# Altium footprint library MOLEX SMD.PcbLib: 54 footprints (part 1 of 4) (continued)
## MOLEX_47151-0001 [mm] "19 Pin, 0.50mm Pitch, 1.0 HDMI Right Angle Header" (continued)
Mechanical 15:
  lines w0.05: -7.75,-11.56 -7.75,1.55 7.75,1.55 7.75,-11.56 -7.75,-11.56
3D body "MOLEX_47151-0001.stp": height 6.18, standoff -2.2, extent -7.5,-11.31 7.5,0.84

## MOLEX_47272-0001 [mm] "20 Circuits, 0.50mm Pitch, Right Angle DisplayPort* Male Receptacle"
height 5.63
pads (25):
  rect 0.28x2.4 smd: 1(4.75,0) 2(4.25,0) 3(3.75,0) 4(3.25,0) 5(2.75,0) 6(2.25,0) 7(1.75,0) 8(1.25,0) 9(0.75,0) 10(0.25,0) 11(-0.25,0) 12(-0.75,0) 13(-1.25,0) 14(-1.75,0) 15(-2.25,0) 16(-2.75,0) 17(-3.25,0) 18(-3.75,0) 19(-4.25,0) 20(-4.75,0)
  round 0.5 hole 1.4 unplated mask+0.45: MTG1(-0.75,-10.28)
  oval 1.2x2.3 hole 0.6 slot 1.7 at 90 deg: SHIELD(-9,-9.38) SHIELD(7.5,-9.38)
  oval 1.2x2.8 hole 0.6 slot 2.2 at 90 deg: SHIELD(-9,-2.6) SHIELD(7.5,-2.6)
Top Overlay:
  circle w0.25: c4.846,1.691 r0.125
  lines w0.2: -9.2,-13.88 -7.4,-13.88 -7.4,-14.58 6.75,-14.58 6.75,-13.88 7.7,-13.88 ; -9.2,-10.91 -9.2,-14.08 cw(c-9.3,-14.08) -9.3,-14.18 -9.645,-14.18 -9.645,-14.58 -9.3,-14.58 ccw(c-9.3,-14.08) -8.8,-14.08 -8.8,-13.88 ; -9.2,-7.85 -9.2,-4.38 ; -9.2,-0.82 -9.2,-0.39 -9.15,-0.39 -9.15,-0.19 -7.2,-0.19 -7.2,-0.601 -5.29,-0.601 ; -8.15,-1.273 -8.15,-0.19 ; -8.006,-1.69 6.506,-1.69 ; -7.75,-1.69 -7.75,-0.19 ; -7.4,-14.18 6.75,-14.18 ; -7.4,-14.08 6.75,-14.08 ; -6.35,-7.66 -6.35,-9.96 cw(c-6.45,-9.96) -6.45,-10.06 -7.05,-10.06 cw(c-7.05,-9.96) -7.15,-9.96 -7.15,-7.66 cw(c-7.05,-7.66) -7.05,-7.56 -6.45,-7.56 cw(c-6.45,-7.66) -6.35,-7.66 ; 5.29,-0.601 5.7,-0.601 5.7,-0.19 7.65,-0.19 7.65,-0.811 ; 5.85,-7.66 5.85,-9.96 ccw(c5.95,-9.96) 5.95,-10.06 6.508,-10.06 ; 5.85,-7.66 cw(c5.95,-7.66) 5.95,-7.56 6.55,-7.56 cw(c6.55,-7.66) 6.65,-7.66 6.65,-8.303 ; 6.25,-1.69 6.25,-0.19 ; 7.15,-0.863 7.15,-0.19 ; 7.3,-13.88 7.3,-14.08 ccw(c7.8,-14.08) 7.8,-14.58 8.14,-14.58 8.14,-14.18 7.8,-14.18 cw(c7.8,-14.08) 7.7,-14.08 7.7,-10.91 ; 7.65,-0.39 7.7,-0.39 7.7,-0.82 ; 7.7,-7.85 7.7,-4.38 ; -4.925,-11.08 ccw(c-4.425,-11.08) -4.425,-11.58 -2.835,-11.58 ccw(c-2.835,-11.08) -2.335,-11.08 -2.335,-7.08 ccw(c-2.585,-7.08) -2.835,-7.08 -2.835,-7.34 -3.035,-9.79 -3.035,-10.99 -4.235,-10.99 -4.235,-9.79 -4.435,-7.34 -4.435,-7.13 -4.425,-7.13 -4.425,-7.08 ccw(c-4.675,-7.08) -4.925,-7.08 -4.925,-11.08 ; 0.835,-11.08 ccw(c1.335,-11.08) 1.335,-11.58 2.925,-11.58 ccw(c2.925,-11.08) 3.425,-11.08 3.425,-7.08 ccw(c3.175,-7.08) 2.925,-7.08 2.925,-7.13 2.935,-7.13 2.935,-7.34 2.735,-9.79 2.735,-10.99 1.535,-10.99 1.535,-9.79 1.335,-7.34 1.335,-7.08 ccw(c1.085,-7.08) 0.835,-7.08 0.835,-11.08
Mechanical 8:
  drawing of 179 lines, arcs and shapes, not listed
Mechanical 14:
  circle w0.25: c4.846,1.691 r0.125
  lines w0.1: -9.2,-13.88 -7.4,-13.88 -7.4,-14.58 6.75,-14.58 6.75,-13.88 7.7,-13.88 ; -9.2,-1.69 7.7,-1.69 ; -8.8,-13.88 -8.8,-14.08 cw(c-9.3,-14.08) -9.3,-14.58 -9.645,-14.58 -9.645,-14.18 -9.3,-14.18 ccw(c-9.3,-14.08) -9.2,-14.08 -9.2,-0.39 -9.15,-0.39 -9.15,-0.19 -7.2,-0.19 -7.2,-0.601 5.7,-0.601 5.7,-0.19 7.65,-0.19 7.65,-1.69 ; -8.15,-1.69 -8.15,-0.19 ; -7.75,-1.69 -7.75,-0.19 ; -7.4,-14.18 6.75,-14.18 ; -7.4,-14.08 6.75,-14.08 ; -6.35,-7.66 -6.35,-9.96 cw(c-6.45,-9.96) -6.45,-10.06 -7.05,-10.06 cw(c-7.05,-9.96) -7.15,-9.96 -7.15,-7.66 cw(c-7.05,-7.66) -7.05,-7.56 -6.45,-7.56 cw(c-6.45,-7.66) -6.35,-7.66 ; 5.85,-7.66 5.85,-9.96 ccw(c5.95,-9.96) 5.95,-10.06 6.55,-10.06 ccw(c6.55,-9.96) 6.65,-9.96 6.65,-7.66 ccw(c6.55,-7.66) 6.55,-7.56 5.95,-7.56 ccw(c5.95,-7.66) 5.85,-7.66 ; 6.25,-1.69 6.25,-0.19 ; 7.15,-1.69 7.15,-0.19 ; 7.3,-13.88 7.3,-14.08 ccw(c7.8,-14.08) 7.8,-14.58 8.14,-14.58 8.14,-14.18 7.8,-14.18 cw(c7.8,-14.08) 7.7,-14.08 7.7,-0.39 7.65,-0.39 ; -4.925,-11.08 ccw(c-4.425,-11.08) -4.425,-11.58 -2.835,-11.58 ccw(c-2.835,-11.08) -2.335,-11.08 -2.335,-7.08 ccw(c-2.585,-7.08) -2.835,-7.08 -2.835,-7.34 -3.035,-9.79 -3.035,-10.99 -4.235,-10.99 -4.235,-9.79 -4.435,-7.34 -4.435,-7.13 -4.425,-7.13 -4.425,-7.08 ccw(c-4.675,-7.08) -4.925,-7.08 -4.925,-11.08 ; 0.835,-11.08 ccw(c1.335,-11.08) 1.335,-11.58 2.925,-11.58 ccw(c2.925,-11.08) 3.425,-11.08 3.425,-7.08 ccw(c3.175,-7.08) 2.925,-7.08 2.925,-7.13 2.935,-7.13 2.935,-7.34 2.735,-9.79 2.735,-10.99 1.535,-10.99 1.535,-9.79 1.335,-7.34 1.335,-7.08 ccw(c1.085,-7.08) 0.835,-7.08 0.835,-11.08
Mechanical 15:
  lines w0.05: -9.895,-14.83 8.39,-14.83 8.39,1.45 -9.895,1.45 -9.895,-14.83
3D body "MOLEX_47272-0001.stp": height 6.65, standoff -2.1, extent -9.645,-14.58 8.14,0.31

## MOLEX_47309-2651 [mm] "1.10mm Pitch microSD Card Header with Detect Switch"
height 2.65
pads (12):
  rect 0.6x1.25 smd: 1(3.85,0) 2(2.75,0) 3(1.65,0) 4(0.55,0) 5(-0.55,0) 6(-1.65,0) 7(-2.75,0) 8(-3.85,0)
  rect 1.2x3.79 smd: G1(-5,-2.48)
  rect 1.45x1.4 smd: G2(5.475,-1.725)
  rect 1x0.6 smd: G3(5.7,-2.975)
  rect 0.95x0.85 smd: G4(4.775,-3.95)
Top Overlay:
  circle w0.25: c3.85,1.975 r0.125
  lines w0.2: -5.4,-0.235 -5.4,0.425 -4.5,0.425 ; -4.05,-4.175 3.95,-4.175 ; -3.3,0.975 -3.3,1.325 3.9,1.325 3.9,0.975 ; 4.5,0.425 6,0.425 6,-0.675 ; 4.526,0.425 cw(c4.83,0.165) 4.881,0.562 ccw(c4.9,0.705) 4.955,0.839 5.104,0.925 cw(c4.9,0.705) 5.007,0.425 ; 4.6,-0.675 4.6,-0.585 5,-0.585 5,-0.675 5.4,-0.675 5.4,-0.585 6,-0.585 ; 5.35,0.425 5.35,1.125 5.5,1.125 5.5,0.425 ; 5.6,-4.175 6,-4.175 6,-3.625
Mechanical 8:
  lines w0.05: -0.354,-0.354 0,0 ; -0.354,0.354 0,0 ; 0.354,-0.354 0,0 ; 0.354,0.354 0,0 ; -5.6,-4.375 -5,-2.48 -4.4,-4.375 ; -5.6,-4.375 -4.4,-4.375 ; -5.6,-4.375 -5.6,-0.585 -4.4,-0.585 -4.4,-4.375 ; -4.15,0.625 -3.85,0 -3.55,0.625 ; -4.15,0.625 -4.15,-0.625 -3.55,-0.625 -3.55,0.625 ; -4.15,0.625 -3.55,0.625 ; -3.05,0.625 -2.75,0 -2.45,0.625 ; -3.05,0.625 -3.05,-0.625 -2.45,-0.625 -2.45,0.625 ; -3.05,0.625 -2.45,0.625 ; -1.95,0.625 -1.65,0 -1.35,0.625 ; -1.95,0.625 -1.95,-0.625 -1.35,-0.625 -1.35,0.625 ; -1.95,0.625 -1.35,0.625 ; -0.85,0.625 -0.55,0 -0.25,0.625 ; -0.85,0.625 -0.85,-0.625 -0.25,-0.625 -0.25,0.625 ; -0.85,0.625 -0.25,0.625 ; 0.25,0.625 0.55,0 0.85,0.625 ; 0.25,0.625 0.25,-0.625 0.85,-0.625 0.85,0.625 ; 0.25,0.625 0.85,0.625 ; 1.35,0.625 1.65,0 1.95,0.625 ; 1.35,0.625 1.35,-0.625 1.95,-0.625 1.95,0.625 ; 1.35,0.625 1.95,0.625 ; 2.45,0.625 2.75,0 3.05,0.625 ; 2.45,0.625 2.45,-0.625 3.05,-0.625 3.05,0.625 ; 2.45,0.625 3.05,0.625 ; 3.55,0.625 3.85,0 4.15,0.625 ; 3.55,0.625 3.55,-0.625 4.15,-0.625 4.15,0.625 ; 3.55,0.625 4.15,0.625 ; 4.3,-4.375 4.775,-3.95 5.25,-4.375 ; 4.3,-4.375 5.25,-4.375 ; 4.3,-4.375 4.3,-3.525 5.25,-3.525 5.25,-4.375 ; 4.75,-2.425 5.475,-1.725 6.2,-2.425 ; 4.75,-2.425 6.2,-2.425 ; 4.75,-2.425 4.75,-1.025 6.2,-1.025 6.2,-2.425 ; 5.2,-3.275 5.7,-2.975 6.2,-3.275 ; 5.2,-3.275 6.2,-3.275 ; 5.2,-3.275 5.2,-2.675 6.2,-2.675 6.2,-3.275
Mechanical 14:
  lines w0.1: -4,0.425 -4,0.475 -3.7,0.475 -3.7,0.425 ; 3.913,0.475 4,0.475 4,0.425 ; 4.526,0.425 cw(c4.83,0.165) 4.881,0.562 ccw(c4.9,0.705) 4.955,0.839 5.104,0.925 cw(c4.9,0.705) 5.007,0.425 ; 5,-1.935 5.4,-1.935 ; 5,-1.508 5.4,-1.508 ; 5,-1.102 5.4,-1.102 ; 5,-0.675 5.4,-0.675 ; 5.35,0.425 5.35,1.125 5.5,1.125 5.5,0.425 ; 6,-2.025 5.4,-2.025 5.4,-0.585 6,-0.585 ; 4,0.425 cw(c4,0.525) 3.9,0.525 3.9,1.325 -3.3,1.325 -3.3,0.525 cw(c-3.4,0.525) -3.4,0.425 -5.4,0.425 -5.4,-4.175 6,-4.175 6,0.425 4,0.425 ; 4.6,-2.025 4.6,-0.585 5,-0.585 5,-2.025 4.6,-2.025
Mechanical 15:
  lines w0.05: -5.85,-4.625 -5.85,1.575 6.45,1.575 6.45,-4.625 -5.85,-4.625
3D body "MOLEX_47309-2651.stp": height 2.65, standoff 0, extent -5.4,-4.175 6,1.325

## MOLEX_48307-7022 [mm] "19 Contacts, Pitch 0.5mm, Vertical, HDMI Receptacle"
height 10.7
pads (24):
  rect 0.3x1.7 smd: 1(4.201,3.215) 2(3.701,3.215) 3(3.201,3.215) 4(2.701,3.215) 5(2.201,3.215) 6(1.701,3.215) 7(1.201,3.215) 8(0.701,3.215) 9(0.201,3.215) 10(-0.299,3.215) 11(-0.799,3.215) 12(-1.299,3.215) 13(-1.799,3.215) 14(-2.299,3.215) 15(-2.799,3.215) 16(-3.299,3.215) 17(-3.799,3.215) 18(-4.299,3.215) 19(-4.799,3.215) NC1(5.201,3.215) NC2(4.701,3.215)
  round 1.9 hole 1.3: SHIELD(-7.259,0.765) SHIELD(-0.009,-2.535) SHIELD(7.241,0.765)
Top Overlay:
  drawing of 208 lines, arcs and shapes, not listed
Mechanical 8:
  circle w0.1: c-0.009,-2.535 r0.95
  circle w0.1: c-7.259,0.765 r0.95
  circle w0.1: c7.241,0.765 r0.95
  lines w0.1: -14.259,0.765 -13.759,0.765 ; -13.759,0.265 -13.759,0.765 ; -13.759,1.265 -13.759,0.765 ; -13.259,0.765 -13.759,0.765 ; -7.759,0.765 -7.259,0.765 ; -7.259,0.265 -7.259,0.765 ; -7.259,1.265 -7.259,0.765 ; -6.759,0.765 -7.259,0.765 ; -0.659,-2.535 0.641,-2.535 ; -0.509,-2.535 -0.009,-2.535 ; -0.009,-3.035 -0.009,-2.535 ; -0.009,-2.035 -0.009,-2.535 ; 0.491,-2.535 -0.009,-2.535 ; 6.741,0.765 7.241,0.765 ; 7.241,0.265 7.241,0.765 ; 7.241,1.265 7.241,0.765 ; 7.741,0.765 7.241,0.765 ; 13.241,0.765 13.741,0.765 ; 13.741,0.265 13.741,0.765 ; 13.741,1.265 13.741,0.765 ; 14.241,0.765 13.741,0.765 ; -4.949,4.065 -4.799,3.215 -4.649,4.065 ; -4.949,4.065 -4.649,4.065 ; -4.949,4.065 -4.949,2.365 -4.649,2.365 -4.649,4.065 ; -4.449,4.065 -4.299,3.215 -4.149,4.065 ; -4.449,4.065 -4.149,4.065 ; -4.449,4.065 -4.449,2.365 -4.149,2.365 -4.149,4.065 ; -3.949,4.065 -3.799,3.215 -3.649,4.065 ; -3.949,4.065 -3.649,4.065 ; -3.949,4.065 -3.949,2.365 -3.649,2.365 -3.649,4.065 ; -3.449,4.065 -3.299,3.215 -3.149,4.065 ; -3.449,4.065 -3.149,4.065 ; -3.449,4.065 -3.449,2.365 -3.149,2.365 -3.149,4.065 ; -2.949,4.065 -2.799,3.215 -2.649,4.065 ; -2.949,4.065 -2.649,4.065 ; -2.949,4.065 -2.949,2.365 -2.649,2.365 -2.649,4.065 ; -2.449,4.065 -2.299,3.215 -2.149,4.065 ; -2.449,4.065 -2.149,4.065 ; -2.449,4.065 -2.449,2.365 -2.149,2.365 -2.149,4.065 ; -1.949,4.065 -1.799,3.215 -1.649,4.065 ; -1.949,4.065 -1.649,4.065 ; -1.949,4.065 -1.949,2.365 -1.649,2.365 -1.649,4.065 ; -1.449,4.065 -1.299,3.215 -1.149,4.065 ; -1.449,4.065 -1.149,4.065 ; -1.449,4.065 -1.449,2.365 -1.149,2.365 -1.149,4.065 ; -0.949,4.065 -0.799,3.215 -0.649,4.065 ; -0.949,4.065 -0.649,4.065 ; -0.949,4.065 -0.949,2.365 -0.649,2.365 -0.649,4.065 ; -0.449,4.065 -0.299,3.215 -0.149,4.065 ; -0.449,4.065 -0.149,4.065 ; -0.449,4.065 -0.449,2.365 -0.149,2.365 -0.149,4.065 ; 0.051,4.065 0.201,3.215 0.351,4.065 ; 0.051,4.065 0.351,4.065 ; 0.051,4.065 0.051,2.365 0.351,2.365 0.351,4.065 ; 0.551,4.065 0.701,3.215 0.851,4.065 ; 0.551,4.065 0.851,4.065 ; 0.551,4.065 0.551,2.365 0.851,2.365 0.851,4.065 ; 1.051,4.065 1.201,3.215 1.351,4.065 ; 1.051,4.065 1.351,4.065 ; 1.051,4.065 1.051,2.365 1.351,2.365 1.351,4.065 ; 1.551,4.065 1.701,3.215 1.851,4.065 ; 1.551,4.065 1.851,4.065 ; 1.551,4.065 1.551,2.365 1.851,2.365 1.851,4.065 ; 2.051,4.065 2.201,3.215 2.351,4.065 ; 2.051,4.065 2.351,4.065 ; 2.051,4.065 2.051,2.365 2.351,2.365 2.351,4.065 ; 2.551,4.065 2.701,3.215 2.851,4.065 ; 2.551,4.065 2.851,4.065 ; 2.551,4.065 2.551,2.365 2.851,2.365 2.851,4.065 ; 3.051,4.065 3.201,3.215 3.351,4.065 ; 3.051,4.065 3.351,4.065 ; 3.051,4.065 3.051,2.365 3.351,2.365 3.351,4.065 ; 3.551,4.065 3.701,3.215 3.851,4.065 ; 3.551,4.065 3.851,4.065 ; 3.551,4.065 3.551,2.365 3.851,2.365 3.851,4.065 ; 4.051,4.065 4.201,3.215 4.351,4.065 ; 4.051,4.065 4.351,4.065 ; 4.051,4.065 4.051,2.365 4.351,2.365 4.351,4.065 ; 4.551,4.065 4.701,3.215 4.851,4.065 ; 4.551,4.065 4.851,4.065 ; 4.551,4.065 4.551,2.365 4.851,2.365 4.851,4.065 ; 5.051,4.065 5.201,3.215 5.351,4.065 ; 5.051,4.065 5.351,4.065 ; 5.051,4.065 5.051,2.365 5.351,2.365 5.351,4.065
Mechanical 14:
  drawing of 235 lines, arcs and shapes, not listed
Mechanical 15:
  lines w0.05: -17.059,-4.435 -17.059,4.765 17.041,4.765 17.041,-4.435 -17.059,-4.435
3D body "MOLEX_48307-7022.stp": height 10.55, standoff -2.45, extent -16.8,-4.175 16.8,4.525

## MOLEX_51338-0474 [mm] "0.40mm Pitch SlimStack Dual Row 40 Circuits Surface Mount Vertical Receptacle"
height 1.36
pads (44):
  rect 0.22x0.7 smd: 1(-3.8,1.55) 2(-3.8,-1.55) 3(-3.4,1.55) 4(-3.4,-1.55) 5(-3,1.55) 6(-3,-1.55) 7(-2.6,1.55) 8(-2.6,-1.55) 9(-2.2,1.55) 10(-2.2,-1.55) 11(-1.8,1.55) 12(-1.8,-1.55) 13(-1.4,1.55) 14(-1.4,-1.55) 15(-1,1.55) 16(-1,-1.55) 17(-0.6,1.55) 18(-0.6,-1.55) 19(-0.2,1.55) 20(-0.2,-1.55) 21(0.2,1.55) 22(0.2,-1.55) 23(0.6,1.55) 24(0.6,-1.55) 25(1,1.55) 26(1,-1.55) 27(1.4,1.55) 28(1.4,-1.55) 29(1.8,1.55) 30(1.8,-1.55) 31(2.2,1.55) 32(2.2,-1.55) 33(2.6,1.55) 34(2.6,-1.55) 35(3,1.55) 36(3,-1.55) 37(3.4,1.55) 38(3.4,-1.55) 39(3.8,1.55) 40(3.8,-1.55)
  rect 1x0.5 smd: MECH(-4.75,-1.5) MECH(-4.75,1.5) MECH(4.75,-1.5) MECH(4.75,1.5)
Top Layer:
  region: -3.69,1.9 -3.91,1.9 -3.91,0.75 -3.69,0.75
  region: -3.91,-1.9 -3.69,-1.9 -3.69,-0.75 -3.91,-0.75
  region: -3.29,1.9 -3.51,1.9 -3.51,0.75 -3.29,0.75
  region: -3.51,-1.9 -3.29,-1.9 -3.29,-0.75 -3.51,-0.75
  region: -2.89,1.9 -3.11,1.9 -3.11,0.75 -2.89,0.75
  region: -3.11,-1.9 -2.89,-1.9 -2.89,-0.75 -3.11,-0.75
  region: -2.49,1.9 -2.71,1.9 -2.71,0.75 -2.49,0.75
  region: -2.71,-1.9 -2.49,-1.9 -2.49,-0.75 -2.71,-0.75
  region: -2.09,1.9 -2.31,1.9 -2.31,0.75 -2.09,0.75
  region: -2.31,-1.9 -2.09,-1.9 -2.09,-0.75 -2.31,-0.75
  region: -1.69,1.9 -1.91,1.9 -1.91,0.75 -1.69,0.75
  region: -1.91,-1.9 -1.69,-1.9 -1.69,-0.75 -1.91,-0.75
  region: -1.29,1.9 -1.51,1.9 -1.51,0.75 -1.29,0.75
  region: -1.51,-1.9 -1.29,-1.9 -1.29,-0.75 -1.51,-0.75
  region: -0.89,1.9 -1.11,1.9 -1.11,0.75 -0.89,0.75
  region: -1.11,-1.9 -0.89,-1.9 -0.89,-0.75 -1.11,-0.75
  region: -0.49,1.9 -0.71,1.9 -0.71,0.75 -0.49,0.75
  region: -0.71,-1.9 -0.49,-1.9 -0.49,-0.75 -0.71,-0.75
  region: -0.09,1.9 -0.31,1.9 -0.31,0.75 -0.09,0.75
  region: -0.31,-1.9 -0.09,-1.9 -0.09,-0.75 -0.31,-0.75
  region: 0.31,1.9 0.09,1.9 0.09,0.75 0.31,0.75
  region: 0.09,-1.9 0.31,-1.9 0.31,-0.75 0.09,-0.75
  region: 0.71,1.9 0.49,1.9 0.49,0.75 0.71,0.75
  region: 0.49,-1.9 0.71,-1.9 0.71,-0.75 0.49,-0.75
  region: 1.11,1.9 0.89,1.9 0.89,0.75 1.11,0.75
  region: 0.89,-1.9 1.11,-1.9 1.11,-0.75 0.89,-0.75
  region: 1.51,1.9 1.29,1.9 1.29,0.75 1.51,0.75
  region: 1.29,-1.9 1.51,-1.9 1.51,-0.75 1.29,-0.75
  region: 1.91,1.9 1.69,1.9 1.69,0.75 1.91,0.75
  region: 1.69,-1.9 1.91,-1.9 1.91,-0.75 1.69,-0.75
  region: 2.31,1.9 2.09,1.9 2.09,0.75 2.31,0.75
  region: 2.09,-1.9 2.31,-1.9 2.31,-0.75 2.09,-0.75
  region: 2.71,1.9 2.49,1.9 2.49,0.75 2.71,0.75
  region: 2.49,-1.9 2.71,-1.9 2.71,-0.75 2.49,-0.75
  region: 3.11,1.9 2.89,1.9 2.89,0.75 3.11,0.75
  region: 2.89,-1.9 3.11,-1.9 3.11,-0.75 2.89,-0.75
  region: 3.51,1.9 3.29,1.9 3.29,0.75 3.51,0.75
  region: 3.29,-1.9 3.51,-1.9 3.51,-0.75 3.29,-0.75
  region: 3.91,1.9 3.69,1.9 3.69,0.75 3.91,0.75
  region: 3.69,-1.9 3.91,-1.9 3.91,-0.75 3.69,-0.75
Top Overlay:
  drawing of 217 lines, arcs and shapes, not listed
Mechanical 8:
  drawing of 284 lines, arcs and shapes, not listed
Mechanical 14:
  drawing of 253 lines, arcs and shapes, not listed
Mechanical 15:
  lines w0.05: -5.797,-2.15 -5.797,2.15 5.8,2.15 5.8,-2.15 -5.797,-2.15
3D body "MOLEX_51338-0474.stp": height 1.4, standoff 0, extent -5.55,-1.705 5.55,1.705

## MOLEX_52610-0871 [mm] "8 Contacts, 1.0mm Pitch,  Vertical Surface Mount FCC/FPC Connector"
height 7.25
pads (16):
  rect 0.6x2.075 smd: 1(-3.5,-1.687) 2(-2.5,-1.687) 3(-1.5,-1.687) 4(-0.5,-1.687) 5(0.5,-1.687) 6(1.5,-1.687) 7(2.5,-1.687) 8(3.5,-1.687)
  rect 0.6x1.85 smd: 1(-3.5,1.825) 2(-2.5,1.825) 3(-1.5,1.825) 4(-0.5,1.825) 5(0.5,1.825) 6(1.5,1.825) 7(2.5,1.825) 8(3.5,1.825)
Top Overlay:
  lines w0.2: -7.3,1.8 -7.3,-1.5 -7,-1.8 -4.2,-1.8 ; -7.295,1.8 -4.2,1.8 ; -6.5,1.8 -6.211,1.3 -5.925,1.8 ; -4.3,1.8 -4.3,1.05 -4.2,1.05 ; 4.2,-1.8 7,-1.8 7.3,-1.5 7.3,1.8 4.2,1.8 ; 4.2,1.05 4.3,1.05 4.3,1.8 ; -4.85,-0.05 -4.85,1.8 -4.6,1.55 -4.6,0.2 ; -4.85,-0.05 4.85,-0.05 ; -4.85,-0.05 -4.6,0.2 ; -4.6,0.2 4.6,0.2 ; 4.6,0.2 4.6,1.55 4.85,1.8 4.85,-0.05 ; 4.6,0.2 4.85,-0.05
Mechanical 8:
  lines w0.1: -7.3,1.8 7.3,1.8 ; -4,-1.687 -3.5,-1.687 ; -4,1.825 -3.5,1.825 ; -3.5,-2.188 -3.5,-1.687 ; -3.5,-1.188 -3.5,-1.687 ; -3.5,1.325 -3.5,1.825 ; -3.5,2.325 -3.5,1.825 ; -3,-1.687 -2.5,-1.687 ; -3,1.825 -2.5,1.825 ; -2.5,-2.188 -2.5,-1.687 ; -2.5,-1.188 -2.5,-1.687 ; -2.5,1.325 -2.5,1.825 ; -2.5,2.325 -2.5,1.825 ; -2,-1.687 -1.5,-1.687 ; -2,1.825 -1.5,1.825 ; -1.5,-2.188 -1.5,-1.687 ; -1.5,-1.188 -1.5,-1.687 ; -1.5,1.325 -1.5,1.825 ; -1.5,2.325 -1.5,1.825 ; -1,-1.687 -0.5,-1.687 ; -1,1.825 -0.5,1.825 ; -0.5,-2.188 -0.5,-1.687 ; -0.5,-1.188 -0.5,-1.687 ; -0.5,0 0,0 ; -0.5,1.325 -0.5,1.825 ; -0.5,2.325 -0.5,1.825 ; 0,-1.687 0.5,-1.687 ; 0,-0.5 0,0 ; 0,0.5 0,0 ; 0,1.825 0.5,1.825 ; 0.5,-2.188 0.5,-1.687 ; 0.5,-1.188 0.5,-1.687 ; 0.5,0 0,0 ; 0.5,1.325 0.5,1.825 ; 0.5,2.325 0.5,1.825 ; 1,-1.687 1.5,-1.687 ; 1,1.825 1.5,1.825 ; 1.5,-2.188 1.5,-1.687 ; 1.5,-1.188 1.5,-1.687 ; 1.5,1.325 1.5,1.825 ; 1.5,2.325 1.5,1.825 ; 2,-1.687 2.5,-1.687 ; 2,1.825 2.5,1.825 ; 2.5,-2.188 2.5,-1.687 ; 2.5,-1.188 2.5,-1.687 ; 2.5,1.325 2.5,1.825 ; 2.5,2.325 2.5,1.825 ; 3,-1.687 3.5,-1.687 ; 3,1.825 3.5,1.825 ; 3.5,-2.188 3.5,-1.687 ; 3.5,-1.188 3.5,-1.687 ; 3.5,1.325 3.5,1.825 ; 3.5,2.325 3.5,1.825 ; -3.8,-2.725 -3.2,-2.725 -3.2,-0.65 -3.8,-0.65 -3.8,-2.725 ; -3.8,0.9 -3.8,2.75 -3.2,2.75 -3.2,0.9 -3.8,0.9 ; -2.8,-2.725 -2.2,-2.725 -2.2,-0.65 -2.8,-0.65 -2.8,-2.725 ; -2.8,0.9 -2.8,2.75 -2.2,2.75 -2.2,0.9 -2.8,0.9 ; -1.8,-2.725 -1.2,-2.725 -1.2,-0.65 -1.8,-0.65 -1.8,-2.725 ; -1.8,0.9 -1.8,2.75 -1.2,2.75 -1.2,0.9 -1.8,0.9 ; -0.8,-2.725 -0.2,-2.725 -0.2,-0.65 -0.8,-0.65 -0.8,-2.725 ; -0.8,0.9 -0.8,2.75 -0.2,2.75 -0.2,0.9 -0.8,0.9 ; 0.2,-2.725 0.8,-2.725 0.8,-0.65 0.2,-0.65 0.2,-2.725 ; 0.2,0.9 0.2,2.75 0.8,2.75 0.8,0.9 0.2,0.9 ; 1.2,-2.725 1.8,-2.725 1.8,-0.65 1.2,-0.65 1.2,-2.725 ; 1.2,0.9 1.2,2.75 1.8,2.75 1.8,0.9 1.2,0.9 ; 2.2,-2.725 2.8,-2.725 2.8,-0.65 2.2,-0.65 2.2,-2.725 ; 2.2,0.9 2.2,2.75 2.8,2.75 2.8,0.9 2.2,0.9 ; 3.2,-2.725 3.8,-2.725 3.8,-0.65 3.2,-0.65 3.2,-2.725 ; 3.2,0.9 3.2,2.75 3.8,2.75 3.8,0.9 3.2,0.9
Mechanical 14:
  lines w0.1: -7.3,1.8 -7.3,-1.5 -7,-1.8 7,-1.8 7.3,-1.5 7.3,1.8 -7.295,1.8 ; -6.5,1.8 -6.211,1.3 -5.925,1.8 ; -4.3,1.8 -4.3,1.05 -3.675,1.05 ; -3.675,0.2 -3.675,1.5 -3.325,1.5 -3.325,0.2 ; -3.675,0.85 -3.325,0.85 ; -3.66,-1.8 -3.66,-2.25 -3.34,-2.25 -3.34,-1.8 ; -3.66,1.8 -3.66,2.25 -3.34,2.25 -3.34,1.8 ; -3.325,1.05 -2.675,1.05 ; -2.675,0.2 -2.675,1.5 -2.325,1.5 -2.325,0.2 ; -2.675,0.85 -2.325,0.85 ; -2.66,-1.8 -2.66,-2.25 -2.34,-2.25 -2.34,-1.8 ; -2.66,1.8 -2.66,2.25 -2.34,2.25 -2.34,1.8 ; -2.325,1.05 -1.675,1.05 ; -1.675,0.2 -1.675,1.5 -1.325,1.5 -1.325,0.2 ; -1.675,0.85 -1.325,0.85 ; -1.66,-1.8 -1.66,-2.25 -1.34,-2.25 -1.34,-1.8 ; -1.66,1.8 -1.66,2.25 -1.34,2.25 -1.34,1.8 ; -1.325,1.05 -0.675,1.05 ; -0.675,0.2 -0.675,1.5 -0.325,1.5 -0.325,0.2 ; -0.675,0.85 -0.325,0.85 ; -0.66,-1.8 -0.66,-2.25 -0.34,-2.25 -0.34,-1.8 ; -0.66,1.8 -0.66,2.25 -0.34,2.25 -0.34,1.8 ; -0.325,1.05 0.325,1.05 ; 0.325,0.2 0.325,1.5 0.675,1.5 0.675,0.2 ; 0.325,0.85 0.675,0.85 ; 0.34,-1.8 0.34,-2.25 0.66,-2.25 0.66,-1.8 ; 0.34,1.8 0.34,2.25 0.66,2.25 0.66,1.8 ; 0.675,1.05 1.325,1.05 ; 1.325,0.2 1.325,1.5 1.675,1.5 1.675,0.2 ; 1.325,0.85 1.675,0.85 ; 1.34,-1.8 1.34,-2.25 1.66,-2.25 1.66,-1.8 ; 1.34,1.8 1.34,2.25 1.66,2.25 1.66,1.8 ; 1.675,1.05 2.325,1.05 ; 2.325,0.2 2.325,1.5 2.675,1.5 2.675,0.2 ; 2.325,0.85 2.675,0.85 ; 2.34,-1.8 2.34,-2.25 2.66,-2.25 2.66,-1.8 ; 2.34,1.8 2.34,2.25 2.66,2.25 2.66,1.8 ; 2.675,1.05 3.325,1.05 ; 3.325,0.2 3.325,1.5 3.675,1.5 3.675,0.2 ; 3.325,0.85 3.675,0.85 ; 3.34,-1.8 3.34,-2.25 3.66,-2.25 3.66,-1.8 ; 3.34,1.8 3.34,2.25 3.66,2.25 3.66,1.8 ; 3.675,1.05 4.3,1.05 4.3,1.8 ; -4.85,-0.05 -4.85,1.8 -4.6,1.55 -4.6,0.2 ; -4.85,-0.05 4.85,-0.05 ; -4.85,-0.05 -4.6,0.2 ; -4.6,0.2 4.6,0.2 ; 4.6,0.2 4.6,1.55 4.85,1.8 4.85,-0.05 ; 4.6,0.2 4.85,-0.05
Mechanical 15:
  lines w0.05: -7.55,-3 -7.55,3 7.55,3 7.55,-3 -7.55,-3
3D body "MOLEX_52610-0871.stp": height 7.25, standoff 0, extent -7.3,-2.25 7.3,2.25

## MOLEX_52745-1097 [mm] "10 Contacts, 0.5mm Pitch, Right Angled Surface Mount FPC Connector, ZIF, Top Contact Style"
height 2
pads (14):
  rect 0.3x0.8 smd: 1(-2.25,0) 2(-1.75,0) 3(-1.25,0) 4(-0.75,0) 5(-0.24,0) 6(0.25,0) 7(0.75,0) 8(1.25,0) 9(1.75,0) 10(2.25,0)
  rect 1.1x2.2 smd: MECH(-5.35,-1.5) MECH(5.35,-1.5)
  rect 1.3x3.05 smd: MECH(-4.15,-1.925) MECH(4.15,-1.925)
Top Layer keep-out:
  lines w0.1: -3.4,-2.34 -3.4,-1 -2.7,-1 -2.7,-2.34 -3.4,-2.34 ; 2.7,-2.34 3.4,-2.34 3.4,-1 2.7,-1 2.7,-2.34
Top Overlay:
  circle w0.25: c-2.994,0.536 r0.125
  lines w0.2: -4.85,-6.3 -4.564,-5.8 -4.275,-6.3 ; -4.65,-3.8 -4.65,-4.1 -3.775,-4.1 -3.775,-3.8 ; -3.975,-5.5 -3.975,-4.1 ; -3.975,-4.7 -4.125,-4.613 -4.125,-4.387 -3.975,-4.3 ; -3.815,-5.5 -3.815,-4.1 ; -3.525,-3.8 -3.525,-4.1 -2.775,-4.1 -2.775,-4.8 -2.675,-4.9 2.675,-4.9 2.775,-4.8 2.775,-4.1 3.525,-4.1 3.525,-3.8 ; -3.325,-5.5 -3.325,-4.426 -3.075,-4.426 ; -3.15,-0.6 -2.75,-0.6 ; -3.075,-5.5 -3.075,-4.426 ; -2.775,-4.216 cw(c-2.985,-4.216) -2.985,-4.426 -3.075,-4.426 ; 2.75,-0.6 3.15,-0.6 ; 2.775,-4.216 ccw(c2.985,-4.216) 2.985,-4.426 3.325,-4.426 3.325,-5.5 ; 3.075,-5.5 3.075,-4.426 ; 3.775,-3.8 3.775,-4.1 4.65,-4.1 4.65,-3.8 ; 3.815,-5.5 3.815,-4.1 ; 3.975,-5.5 3.975,-4.1 ; 3.975,-4.7 4.125,-4.613 4.125,-4.387 3.975,-4.3 ; -5.55,-6.1 ccw(c-5.35,-6.1) -5.35,-6.3 5.35,-6.3 ccw(c5.35,-6.1) 5.55,-6.1 5.55,-5.5 2.825,-5.5 2.825,-6.05 -2.825,-6.05 -2.825,-5.5 -5.55,-5.5 -5.55,-6.1
Mechanical 8:
  lines w0.1: -4.8,-0.4 -4.15,-1.925 -3.5,-0.4 ; -0.5,0 0,0 ; 0,-0.5 0,0 ; 0,0.5 0,0 ; 0.5,0 0,0 ; 4.8,-0.4 4.15,-1.925 3.5,-0.4 ; -5.9,-2.6 -4.8,-2.6 ; -5.9,-2.6 -5.9,-0.4 ; -5.9,-2.6 -5.35,-1.5 -4.8,-2.6 ; -5.9,-0.4 -3.5,-0.4 ; -5.9,-0.4 -4.7,-1.925 -3.5,-3.45 ; -4.8,-2.6 -4.8,-3.45 -3.5,-3.45 ; -3.5,-3.45 -3.5,-0.4 ; -2.4,0.4 -2.25,0 -2.1,0.4 ; -2.4,0.4 -2.4,-0.4 -2.1,-0.4 -2.1,0.4 ; -2.4,0.4 -2.1,0.4 ; -1.9,0.4 -1.75,0 -1.6,0.4 ; -1.9,0.4 -1.9,-0.4 -1.6,-0.4 -1.6,0.4 ; -1.9,0.4 -1.6,0.4 ; -1.4,0.4 -1.25,0 -1.1,0.4 ; -1.4,0.4 -1.4,-0.4 -1.1,-0.4 -1.1,0.4 ; -1.4,0.4 -1.1,0.4 ; -0.9,0.4 -0.75,0 -0.6,0.4 ; -0.9,0.4 -0.9,-0.4 -0.6,-0.4 -0.6,0.4 ; -0.9,0.4 -0.6,0.4 ; -0.4,0.4 -0.25,0 -0.1,0.4 ; -0.4,0.4 -0.4,-0.4 -0.1,-0.4 -0.1,0.4 ; -0.4,0.4 -0.1,0.4 ; 0.1,0.4 0.25,0 0.4,0.4 ; 0.1,0.4 0.1,-0.4 0.4,-0.4 0.4,0.4 ; 0.1,0.4 0.4,0.4 ; 0.6,0.4 0.75,0 0.9,0.4 ; 0.6,0.4 0.6,-0.4 0.9,-0.4 0.9,0.4 ; 0.6,0.4 0.9,0.4 ; 1.1,0.4 1.25,0 1.4,0.4 ; 1.1,0.4 1.1,-0.4 1.4,-0.4 1.4,0.4 ; 1.1,0.4 1.4,0.4 ; 1.6,0.4 1.75,0 1.9,0.4 ; 1.6,0.4 1.6,-0.4 1.9,-0.4 1.9,0.4 ; 1.6,0.4 1.9,0.4 ; 2.1,0.4 2.25,0 2.4,0.4 ; 2.1,0.4 2.1,-0.4 2.4,-0.4 2.4,0.4 ; 2.1,0.4 2.4,0.4 ; 3.5,-3.45 3.5,-0.4 ; 3.5,-3.45 4.8,-3.45 4.8,-2.6 ; 3.5,-3.45 4.7,-1.925 5.9,-0.4 ; 3.5,-0.4 5.9,-0.4 ; 4.8,-2.6 5.9,-2.6 ; 4.8,-2.6 5.35,-1.5 5.9,-2.6 ; 5.9,-2.6 5.9,-0.4 ; -3.4,-2.34 -3.4,-1 -2.7,-1 -2.7,-2.34 -3.4,-2.34 ; 2.7,-2.34 2.7,-1 3.4,-1 3.4,-2.34 2.7,-2.34
Mechanical 14:
  circle w0.25: c-2.994,0.536 r0.125
  lines w0.1: -4.85,-6.3 -4.564,-5.8 -4.275,-6.3 ; -4.65,-1.8 -5.35,-1.8 -5.35,-1.6 -4.85,-1.6 -4.85,-1.3 -5.35,-1.3 -5.35,-1.1 -4.85,-1.1 -4.85,-0.9 -4.65,-0.9 ; -3.975,-5.5 -3.975,-4.1 ; -3.975,-4.7 -4.125,-4.613 -4.125,-4.387 -3.975,-4.3 ; -3.815,-5.5 -3.815,-4.1 ; -3.325,-5.5 -3.325,-4.426 -3.075,-4.426 ; -3.075,-5.5 -3.075,-4.426 ; -2.775,-4.216 cw(c-2.985,-4.216) -2.985,-4.426 -3.075,-4.426 ; -2.35,-0.593 -2.35,0.1 -2.15,0.1 -2.15,-0.593 ; -1.85,-0.593 -1.85,0.1 -1.65,0.1 -1.65,-0.593 ; -1.35,-0.593 -1.35,0.1 -1.15,0.1 -1.15,-0.593 ; -0.85,-0.593 -0.85,0.1 -0.65,0.1 -0.65,-0.593 ; -0.35,-0.593 -0.35,0.1 -0.15,0.1 -0.15,-0.593 ; 0.15,-0.593 0.15,0.1 0.35,0.1 0.35,-0.593 ; 0.65,-0.593 0.65,0.1 0.85,0.1 0.85,-0.593 ; 1.15,-0.593 1.15,0.1 1.35,0.1 1.35,-0.593 ; 1.65,-0.593 1.65,0.1 1.85,0.1 1.85,-0.593 ; 2.15,-0.593 2.15,0.1 2.35,0.1 2.35,-0.593 ; 2.775,-4.216 ccw(c2.985,-4.216) 2.985,-4.426 3.325,-4.426 3.325,-5.5 ; 3.075,-5.5 3.075,-4.426 ; 3.815,-5.5 3.815,-4.1 ; 3.975,-5.5 3.975,-4.1 ; 3.975,-4.7 4.125,-4.613 4.125,-4.387 3.975,-4.3 ; 4.65,-1.8 5.35,-1.8 5.35,-1.6 4.85,-1.6 4.85,-1.3 5.35,-1.3 5.35,-1.1 4.85,-1.1 4.85,-0.9 4.65,-0.9 ; -5.55,-6.1 ccw(c-5.35,-6.1) -5.35,-6.3 5.35,-6.3 ccw(c5.35,-6.1) 5.55,-6.1 5.55,-5.5 2.825,-5.5 2.825,-6.05 -2.825,-6.05 -2.825,-5.5 -5.55,-5.5 -5.55,-6.1 ; -4.65,-4.1 -3.775,-4.1 -3.775,-1.225 cw(c-3.65,-1.225) -3.525,-1.225 -3.525,-4.1 -2.775,-4.1 -2.775,-4.8 -2.675,-4.9 2.675,-4.9 2.775,-4.8 2.775,-4.1 3.525,-4.1 3.525,-1.225 cw(c3.65,-1.225) 3.775,-1.225 3.775,-4.1 4.65,-4.1 4.65,-0.6 -4.65,-0.6 -4.65,-4.1
Mechanical 15:
  lines w0.05: -6.15,-2.85 -5.05,-2.85 -5.05,-3.7 -4.9,-3.7 -4.9,-4.35 -4.375,-4.35 -4.375,-5.25 -5.8,-5.25 -5.8,-6.55 5.8,-6.55 5.8,-5.25 4.375,-5.25 4.375,-4.35 4.9,-4.35 4.9,-3.7 5.05,-3.7 5.05,-2.85 6.15,-2.85 6.15,-0.15 2.65,-0.15 2.65,0.65 -2.65,0.65 -2.65,-0.15 -6.15,-0.15 -6.15,-2.85
3D body "MOLEX_52745-1097.stp": height 2, standoff 0, extent -5.55,-6.3 5.55,0.1